# Altium footprint library common.PcbLib: 552 footprints (part 30 of 35)
Each footprint in its own frame and in the unit in brackets; x right, y up, seen from the top. Pads: shape width x height; smd on the part's side, far side on the other; paste and mask are expansions set on the pad; w line width, h text height; cw(c..) or ccw(c..) is an arc to the next point about the centre after c.
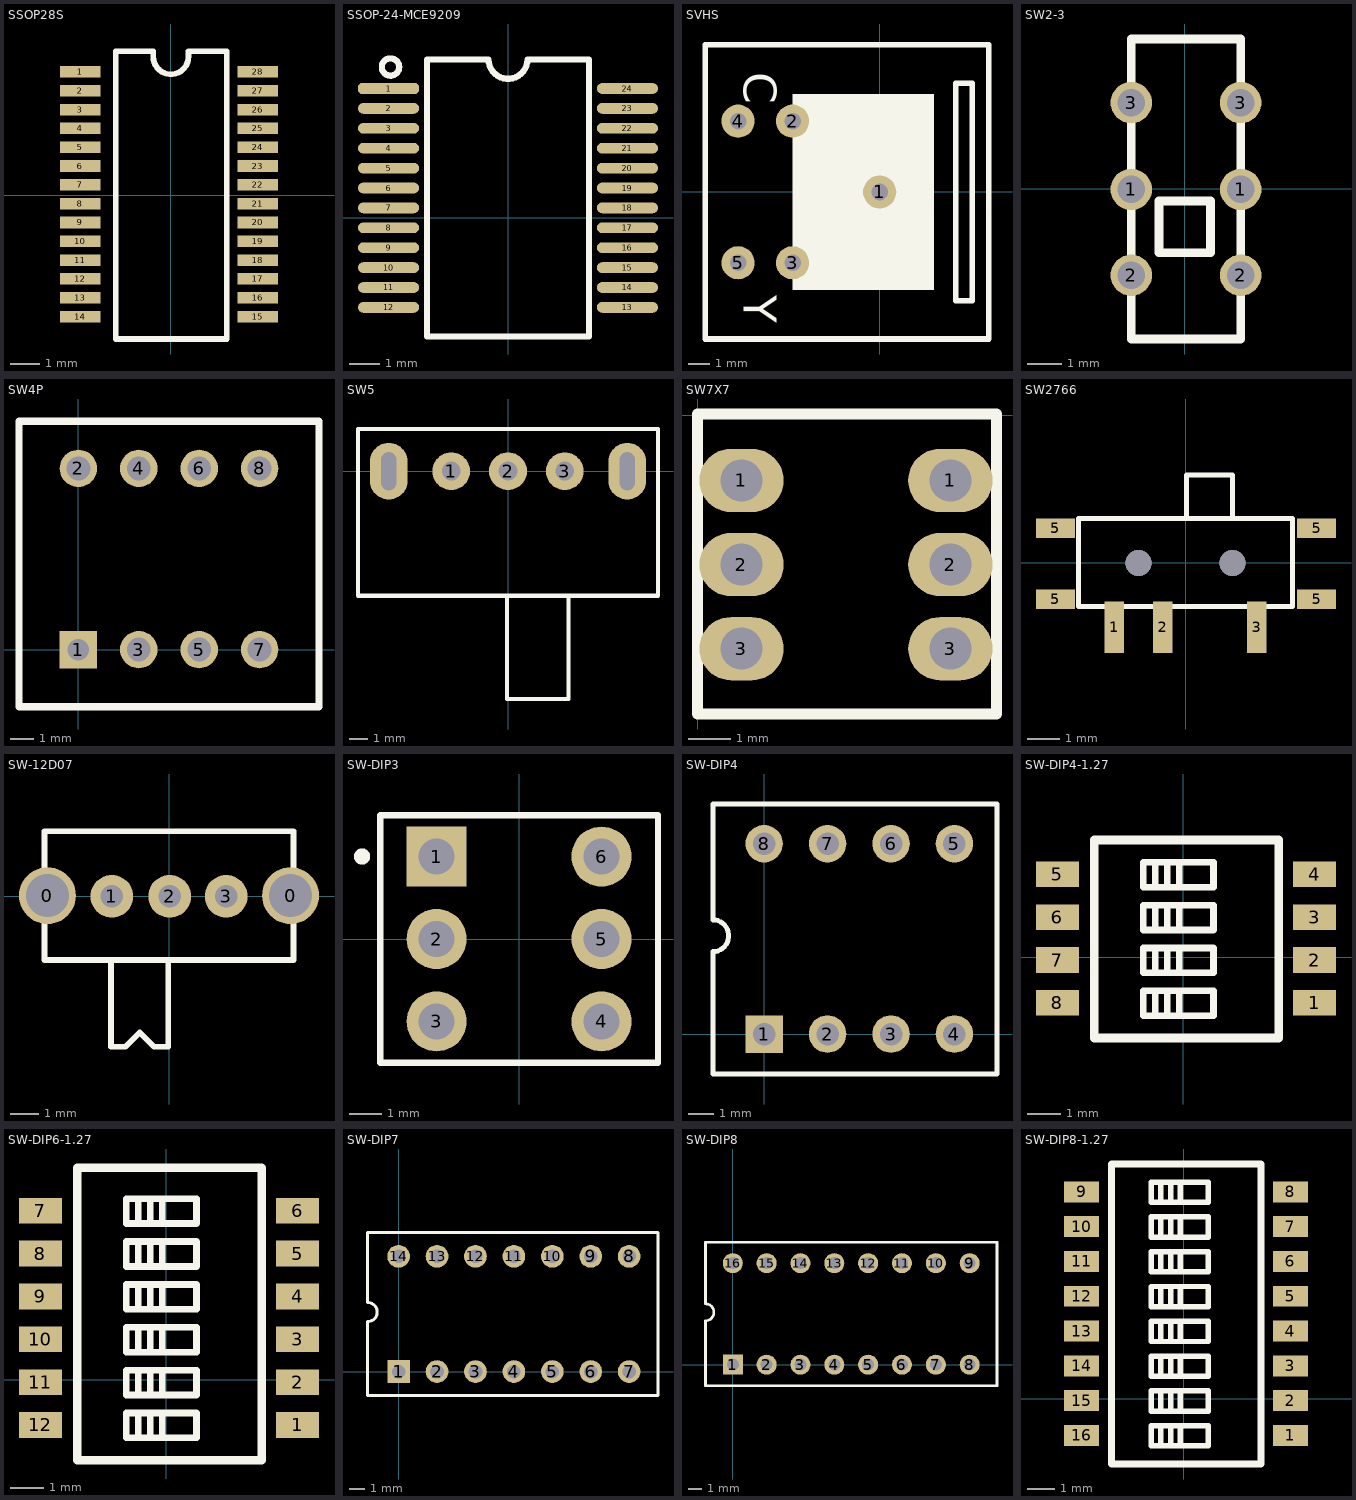
[diagram p29: the footprints below, top view; thin cyan lines are the x and y axes]

## SSOP28S [mil]
pads (28):
  rect 55x15.75 smd: 1(-122.95,167.5) 2(-122.95,141.92) 3(-122.95,116.34) 4(-122.95,90.77) 5(-122.95,65.19) 6(-122.95,39.61) 7(-122.95,14.04) 8(-122.95,-11.54) 9(-122.95,-37.12) 10(-122.95,-62.69) 11(-122.95,-88.27) 12(-122.95,-113.85) 13(-122.95,-139.42) 14(-123,-165) 15(117.95,-165) 16(117.95,-139.42) 17(117.95,-113.85) 18(117.95,-88.27) 19(117.95,-62.69) 20(117.95,-37.12) 21(117.95,-11.54) 22(117.95,14.04) 23(117.95,39.62) 24(117.95,65.19) 25(117.95,90.77) 26(117.95,116.35) 27(117.95,141.92) 28(117.95,167.5)
Top Overlay:
  lines w7.87: -75,-195.5 76,-195.5 76,195.5 23.99,195.5 23.99,188.3 cw(c0,188.3) -23.99,188.3 -23.99,195.5 -75,195.5 -75,-195.5
3D body: height 41.34, standoff 0, extent -128.87,-192.5 130.97,193.32

## SSOP-24-MCE9209 [mm]
pads (24):
  oct 2x0.35 smd: 1(-3.9,4.225)
  oval 2x0.35 smd: 2(-3.9,3.575) 3(-3.9,2.925) 4(-3.9,2.275) 5(-3.9,1.625) 6(-3.9,0.975) 7(-3.9,0.325) 8(-3.9,-0.325) 9(-3.9,-0.975) 10(-3.9,-1.625) 11(-3.9,-2.275) 12(-3.9,-2.925) 13(3.9,-2.925) 14(3.9,-2.275) 15(3.9,-1.625) 16(3.9,-0.975) 17(3.9,-0.325) 18(3.9,0.325) 19(3.9,0.975) 20(3.9,1.625) 21(3.9,2.275) 22(3.9,2.925) 23(3.9,3.575) 24(3.9,4.225)
Top Overlay:
  circle w0.203: c-3.839,4.928 r0.283
  lines w0.203: -2.65,-3.875 -2.65,5.175 -0.635,5.175 ccw(c0,5.175) 0.635,5.175 2.65,5.175 2.65,-3.875 -2.65,-3.875
3D body: height 1.54, standoff 0, extent -4.135,-3.574 3.881,4.826

## SVHS [mil] "S VIDEO PORT"
pads (5):
  round 60 hole 30: 1(0,0) 2(-157.48,127.95) 3(-157.48,-127.95) 4(-255.91,127.95) 5(-255.91,-127.95)
Top Overlay:
  rectangle: -157.48,-177.17 98.43,177.17
  lines w10: -314.96,-265.75 -314.96,265.75 196.85,265.75 196.85,-265.75 -314.96,-265.75 ; 137.8,-196.85 167.32,-196.85 167.32,196.85 137.8,196.85 137.8,-196.85
  text "Y" at -246.06,-187.01 h60
  text "C" at -246.06,216.54 h60
3D body: height 767.72, standoff -59.06, extent -314.96,-255.9 118.11,255.91

## SW2-3 [mm]
pads (6):
  round 1.2 hole 0.8: 1(-1.549,-0.025) 1(1.626,-0.025) 2(-1.549,-2.515) 2(1.626,-2.515) 3(-1.549,2.489) 3(1.626,2.489)
Top Overlay:
  lines w0.254: -1.549,-4.363 -1.549,4.337 1.626,4.337 1.626,-4.363 -1.549,-4.363 ; -0.748,-1.863 -0.748,-0.363 0.752,-0.363 0.752,-1.863 -0.748,-1.863
3D body: height 5.5, standoff -2.95, extent -1.749,-4.551 1.851,4.449

## SW4P [mil]
pads (8):
  rect 62x62 hole 35.43: 1(0,0)
  round 62 hole 39.37: 2(0,300) 3(100,0) 4(100,300) 5(200,0) 6(200,300) 7(300,0) 8(300,300)
Top Overlay:
  lines w12: -98.43,-94.49 398.43,-94.49 398.43,377.95 -98.43,377.95 -98.43,-94.49
3D body: height 409.45, standoff -118.11, extent -81.7,-133.46 379.72,362.6

## SW5 [mm]
pads (5):
  round 2 hole 1: 1(-3,0) 2(0,0) 3(3,0)
  oval 2x3 hole 0.8 slot 2 at 90 deg: ""(-6.3,0) ""(6.3,0)
Top Overlay:
  lines w0.203: -0.051,-6.579 -0.051,-12.04 3.2,-12.04 3.2,-6.579
  lines w0.22: -7.925,-6.579 -7.925,2.235 7.925,2.235 7.925,-6.579 -7.925,-6.579
3D body: height 6.25, standoff -2.85, extent -6.489,-12.266 6.511,0.634

## SW7X7 [mm]
pads (6):
  oval 2x1.5 hole 1: 1(1.041,-1.549) 1(5.994,-1.549) 2(1.041,-3.543) 2(5.994,-3.543) 3(1.041,-5.537) 3(5.994,-5.537)
Top Overlay:
  lines w0.254: 0,-7.087 7.087,-7.087 7.087,0.025 0,0.025 0,-7.087
3D body: height 13, standoff -4, extent -0.02,-7.087 6.98,-0.087

## SW2766 [mm]
pads (7):
  rect 0.6x1.6 smd: 1(-2.2,-1.981) 2(-0.7,-1.981) 3(2.2,-1.981)
  rect 1.2x0.6 smd: 5(-4.013,-1.118) 5(-4.013,1.067) 5(4.039,-1.118) 5(4.039,1.067)
via 1.45,0 diameter 0.8 hole 0.8
via -1.45,0 diameter 0.8 hole 0.8
Top Overlay:
  lines w0.152: 0.025,1.422 0.025,2.718 1.448,2.718 1.448,1.422 ; -3.302,-1.346 -3.302,1.372 3.302,1.372 3.302,-1.346 -3.302,-1.346
3D body: height 1.4, standoff -0.5, extent -3.85,-2.255 3.85,2.545

## SW-12D07 [mm] "SK12D07"
pads (5):
  round 2 hole 1.5: 0(-4.267,0.025) 0(4.267,0.025)
  round 1.5 hole 0.8: 1(-2.007,0) 2(0.025,0) 3(2.007,0)
Top Overlay:
  lines w0.203: -4.369,-2.235 -4.369,2.286 4.369,2.286 4.369,-2.235 -4.369,-2.235 ; -2.032,-5.283 -1.53,-5.283 -1.029,-4.782 -0.527,-5.283 -0.025,-5.283 -0.025,-2.235 -2.032,-2.235 -2.032,-5.182 -2.032,-5.283
3D body: height 5, standoff -2.49, extent -4.318,-6.167 4.293,2.205

## SW-DIP3 [mm] "Switch; 6 Leads"
pads (6):
  rect 1.85x1.85 hole 1.1: 1(-2.54,2.54)
  round 1.85 hole 1.1: 2(-2.54,0) 3(-2.54,-2.54) 4(2.54,-2.54) 5(2.54,0) 6(2.54,2.54)
Top Overlay:
  circle w0.25: c-4.836,2.541 r0.125
  lines w0.2: -4.28,-3.81 4.28,-3.81 4.28,3.81 -4.28,3.81 -4.28,-3.81
3D body: height 3.55, standoff -0.65, extent -3.81,-3.683 3.81,3.937

## SW-DIP4 [mm] "DIP; 16 Leads; Row Spacing 7.62 mm; Pitch 2.54 mm"
pads (8):
  rect 1.5x1.5 hole 0.9: 1(0,0)
  round 1.5 hole 0.9: 2(2.54,0) 3(5.08,0) 4(7.62,0) 5(7.62,7.62) 6(5.08,7.62) 7(2.54,7.62) 8(0,7.62)
Top Overlay:
  lines w0.2: -2.05,4.57 cw(c-2.05,3.935) -2.05,3.3 -2.05,-1.59 9.322,-1.59 9.322,9.2 -2.05,9.2 -2.05,4.6
3D body: height 7.52, standoff -2.57, extent -1.93,-1.041 9.5,8.611

## SW-DIP4-1.27 [mil]
pads (8):
  rect 50x29.92 smd: 1(153,-53) 2(153,-3) 3(153,47) 4(153,97) 5(-147,97) 6(-147,47) 7(-147,-3) 8(-147,-53)
Top Overlay:
  lines w7.87: -33,-67 -33,-39 ; -33,-17 -33,11 ; -33,33 -33,61 ; -33,83 -33,111 ; -19,-68 -19,-42 ; -19,-18 -19,8 ; -19,32 -19,58 ; -19,82 -19,108 ; -5,-64 -5,-42 ; -5,-14 -5,8 ; -5,36 -5,58 ; -5,86 -5,108 ; -47,-68 -47,-39 35,-39 35,-68 -47,-68 ; -47,-18 -47,11 35,11 35,-18 -47,-18 ; -47,32 35,32 35,61 -47,61 -47,32 ; -47,82 -47,111 35,111 35,82 -47,82
  lines w10: -104,-94 -104,137 111,137 111,-94 -104,-94
3D body: height 59.06, standoff 0, extent -135.67,-103.21 139,145.21

## SW-DIP6-1.27 [mil]
pads (12):
  rect 50x29.92 smd: 1(153,-53) 2(153,-3) 3(153,47) 4(153,97) 5(153,147) 6(153,197) 7(-147,197) 8(-147,147) 9(-147,97) 10(-147,47) 11(-147,-3) 12(-147,-53)
Top Overlay:
  lines w7.87: -33,-67 -33,-39 ; -33,-17 -33,11 ; -33,33 -33,61 ; -33,83 -33,111 ; -33,133 -33,161 ; -33,183 -33,211 ; -19,-68 -19,-42 ; -19,-18 -19,8 ; -19,32 -19,58 ; -19,82 -19,108 ; -19,132 -19,158 ; -19,182 -19,208 ; -5,-64 -5,-42 ; -5,-14 -5,8 ; -5,36 -5,58 ; -5,86 -5,108 ; -5,136 -5,158 ; -5,186 -5,208 ; -47,-68 -47,-39 35,-39 35,-68 -47,-68 ; -47,-18 -47,11 35,11 35,-18 -47,-18 ; -47,32 35,32 35,61 -47,61 -47,32 ; -47,82 -47,111 35,111 35,82 -47,82 ; -47,132 35,132 35,161 -47,161 -47,132 ; -47,182 35,182 35,211 -47,211 -47,182
  lines w10: -104,106 -104,247 111,247 111,106 ; -104,137 -104,-94 111,-94 111,137
3D body: height 59.06, standoff 0, extent -135.67,-3.21 139,245.21
3D body: height 59.06, standoff 0, extent -135.67,-103.21 139,145.21

## SW-DIP7 [mm] "DIP; 16 Leads; Row Spacing 7.62 mm; Pitch 2.54 mm"
pads (14):
  rect 1.5x1.5 hole 0.9: 1(0,0)
  round 1.5 hole 0.9: 2(2.54,0) 3(5.08,0) 4(7.62,0) 5(10.16,0) 6(12.7,0) 7(15.24,0) 8(15.24,7.62) 9(12.7,7.62) 10(10.16,7.62) 11(7.62,7.62) 12(5.08,7.62) 13(2.54,7.62) 14(0,7.62)
Top Overlay:
  lines w0.2: -2.05,4.57 cw(c-2.05,3.935) -2.05,3.3 -2.05,-1.59 17.145,-1.59 17.145,9.2 -2.05,9.2 -2.05,4.6
3D body: height 6.9, standoff -3.2, extent -2.05,-1.245 17.09,8.915

## SW-DIP8 [mm] "DIP; 16 Leads; Row Spacing 7.62 mm; Pitch 2.54 mm"
pads (16):
  rect 1.5x1.5 hole 0.9: 1(0,0)
  round 1.5 hole 0.9: 2(2.54,0) 3(5.08,0) 4(7.62,0) 5(10.16,0) 6(12.7,0) 7(15.24,0) 8(17.78,0) 9(17.78,7.62) 10(15.24,7.62) 11(12.7,7.62) 12(10.16,7.62) 13(7.62,7.62) 14(5.08,7.62) 15(2.54,7.62) 16(0,7.62)
Top Overlay:
  lines w0.2: -2.05,4.57 cw(c-2.05,3.935) -2.05,3.3 -2.05,-1.59 19.83,-1.59 19.83,9.2 -2.05,9.2 -2.05,4.6
3D body: height 8.25, standoff -3.5, extent -2.286,-1.08 20.214,8.7

## SW-DIP8-1.27 [mil]
pads (16):
  rect 50x29.92 smd: 1(153,-53) 2(153,-3) 3(153,47) 4(153,97) 5(153,147) 6(153,197) 7(153,247) 8(153,297) 9(-147,297) 10(-147,247) 11(-147,197) 12(-147,147) 13(-147,97) 14(-147,47) 15(-147,-3) 16(-147,-53)
Top Overlay:
  lines w7.87: -33,-67 -33,-39 ; -33,-17 -33,11 ; -33,33 -33,61 ; -33,83 -33,111 ; -33,133 -33,161 ; -33,183 -33,211 ; -33,233 -33,261 ; -33,283 -33,311 ; -19,-68 -19,-42 ; -19,-18 -19,8 ; -19,32 -19,58 ; -19,82 -19,108 ; -19,132 -19,158 ; -19,182 -19,208 ; -19,232 -19,258 ; -19,282 -19,308 ; -5,-64 -5,-42 ; -5,-14 -5,8 ; -5,36 -5,58 ; -5,86 -5,108 ; -5,136 -5,158 ; -5,186 -5,208 ; -5,236 -5,258 ; -5,286 -5,308 ; -47,-68 35,-68 35,-39 -47,-39 -47,-68 ; -47,-18 35,-18 35,11 -47,11 -47,-18 ; -47,32 -47,61 35,61 35,32 -47,32 ; -47,82 35,82 35,111 -47,111 -47,82 ; -47,132 -47,161 35,161 35,132 -47,132 ; -47,182 -47,211 35,211 35,182 -47,182 ; -47,232 35,232 35,261 -47,261 -47,232 ; -47,282 -47,311 35,311 35,282 -47,282
  lines w10: -104,106 -104,337 111,337 111,106 ; -104,137 -104,-94 111,-94 111,137
3D body: height 59.06, standoff 0, extent -135.67,-103.21 139,145.21
3D body: height 59.06, standoff 0, extent -135.67,96.79 139,345.21